# Altium footprint library TimeCard-NIC-V1.PcbLib: 104 footprints (part 6 of 7)
Each footprint in its own frame and in the unit in brackets; x right, y up, seen from the top. Pads: shape width x height; smd on the part's side, far side on the other; paste and mask are expansions set on the pad; w line width, h text height; cw(c..) or ccw(c..) is an arc to the next point about the centre after c.
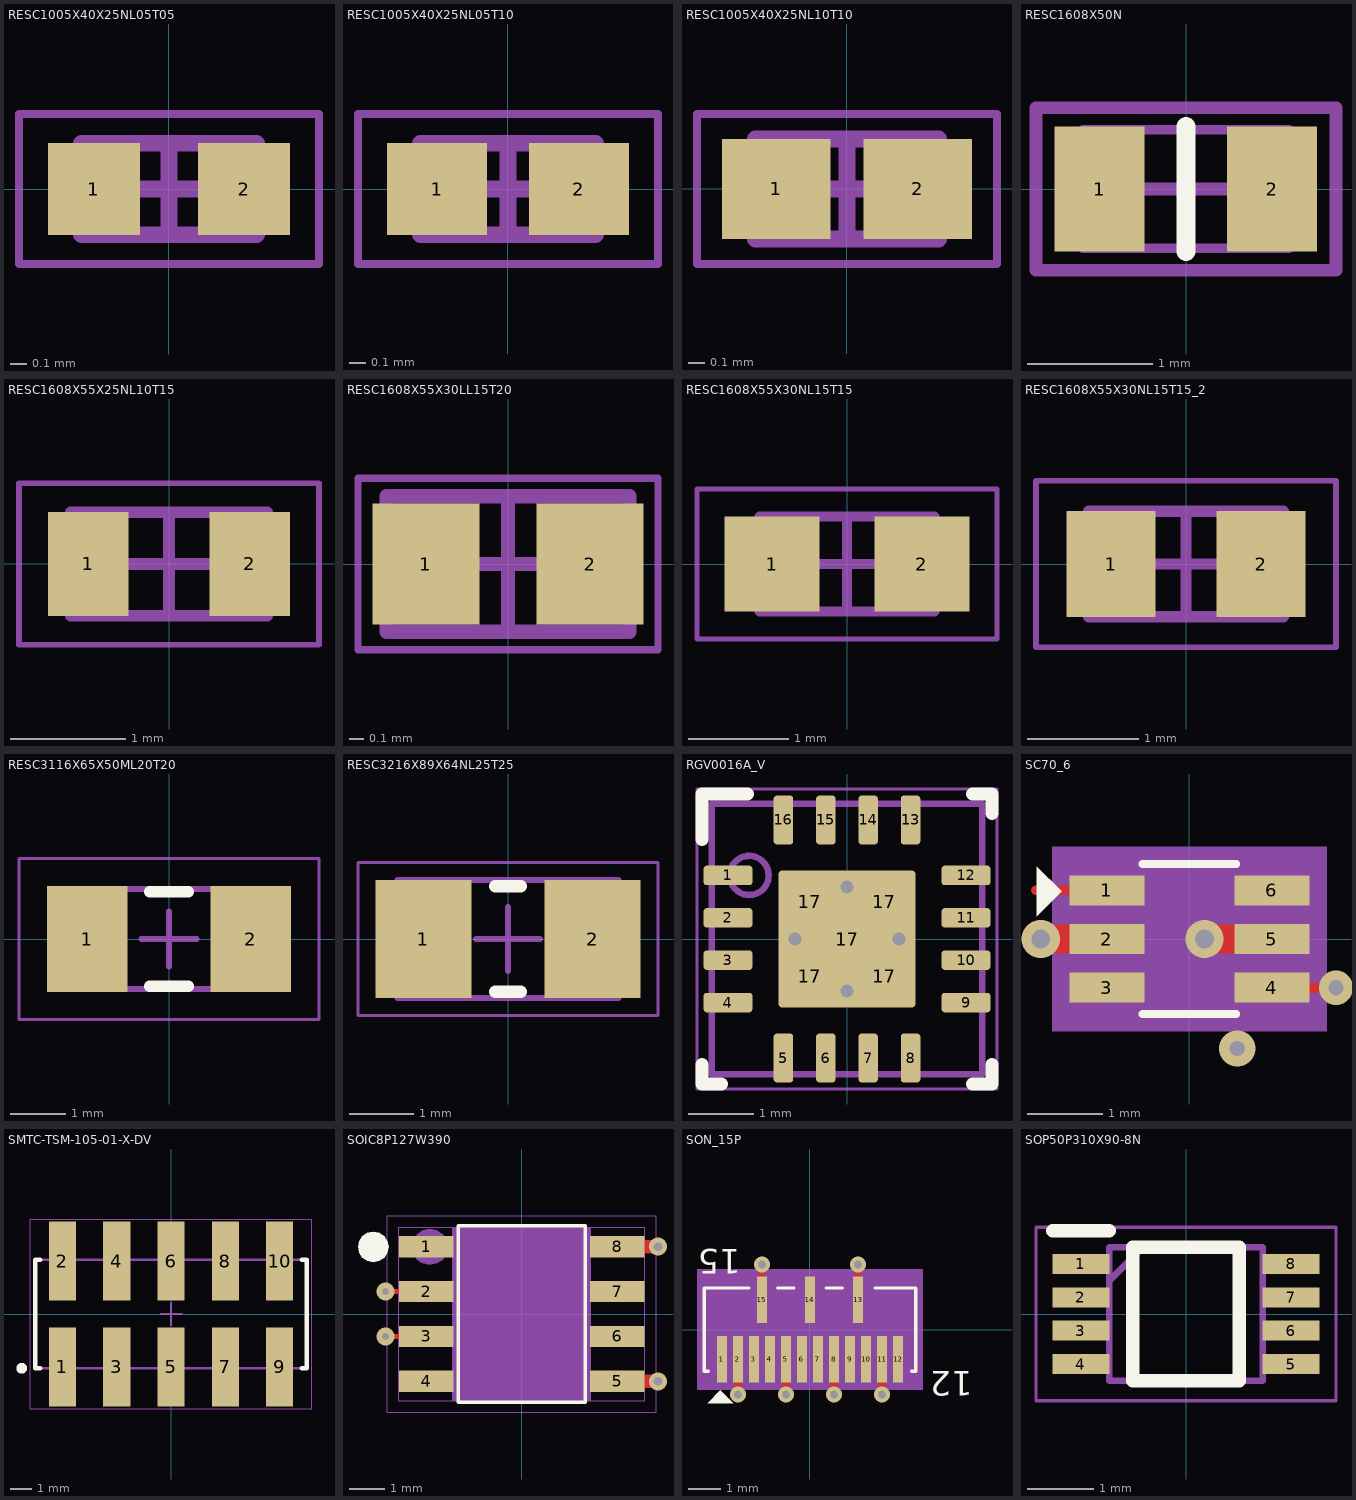
[diagram p5: the footprints below, top view; thin cyan lines are the x and y axes]

## RESC1005X40X25NL05T05 [mm] "Chip Resistor, 2-Leads, Body 1.00x0.50mm, IPC Medium Density"
height 0.4
pads (2):
  rect 0.55x0.55 smd: 1(-0.45,0) 2(0.45,0)
Mechanical 13:
  lines w0.1: -0.525,-0.275 0.525,-0.275 0.525,0.275 -0.525,0.275 -0.525,-0.275
Mechanical 15:
  lines w0.05: -0.9,-0.45 0.9,-0.45 0.9,0.45 -0.9,0.45 -0.9,-0.45
  lines w0.1: -0.275,0 0.275,0 ; 0,-0.275 0,0.275
3D body: height 0.4, standoff 0, extent 0.275,-0.275 0.525,0.275
3D body: height 0.4, standoff 0, extent -0.525,-0.275 -0.275,0.275
3D body: height 0.4, standoff 0, extent -0.275,-0.275 0.275,0.275

## RESC1005X40X25NL05T10 [mm] "Chip Resistor, 2-Leads, Body 1.00x0.50mm, IPC Medium Density"
height 0.4
pads (2):
  rect 0.6x0.55 smd: 1(-0.425,0) 2(0.425,0)
Mechanical 13:
  lines w0.1: -0.525,-0.275 0.525,-0.275 0.525,0.275 -0.525,0.275 -0.525,-0.275
Mechanical 15:
  lines w0.05: -0.9,-0.45 0.9,-0.45 0.9,0.45 -0.9,0.45 -0.9,-0.45
  lines w0.1: -0.275,0 0.275,0 ; 0,-0.275 0,0.275
3D body: height 0.4, standoff 0, extent 0.275,-0.275 0.525,0.275
3D body: height 0.4, standoff 0, extent -0.525,-0.275 -0.275,0.275
3D body: height 0.4, standoff 0, extent -0.275,-0.275 0.275,0.275

## RESC1005X40X25NL10T10 [mm] "Chip Resistor, 2-Leads, Body 1.00x0.50mm, IPC Medium Density"
height 0.4
pads (2):
  rect 0.65x0.6 smd: 1(-0.425,0) 2(0.425,0)
Mechanical 13:
  lines w0.1: -0.55,-0.3 0.55,-0.3 0.55,0.3 -0.55,0.3 -0.55,-0.3
Mechanical 15:
  lines w0.05: -0.9,-0.45 0.9,-0.45 0.9,0.45 -0.9,0.45 -0.9,-0.45
  lines w0.1: -0.3,0 0.3,0 ; 0,-0.3 0,0.3
3D body: height 0.4, standoff 0, extent 0.3,-0.3 0.55,0.3
3D body: height 0.4, standoff 0, extent -0.55,-0.3 -0.3,0.3
3D body: height 0.4, standoff 0, extent -0.3,-0.3 0.3,0.3

## RESC1608X50N [mm] "Chip Resistor, 0603, 2-Leads, Body 1.57x0.85mm, IPC Medium Density"
height 0.5
pads (2):
  rect 0.72x1 smd: 1(-0.69,0) 2(0.69,0)
Top Overlay:
  lines w0.152: 0,-0.5 0,0.5
Mechanical 13:
  lines w0.076: -0.825,-0.475 0.825,-0.475 0.825,0.475 -0.825,0.475 -0.825,-0.475
  text ".Designator" at -0.774,-0.327 h1.02
Mechanical 15:
  lines w0.102: -0.475,0 0.475,0 ; 0,-0.475 0,0.475 ; -1.2,-0.65 1.2,-0.65 1.2,0.65 -1.2,0.65 -1.2,-0.65
3D body: height 0.5, standoff 0, extent 0.525,-0.475 0.825,0.475
3D body: height 0.5, standoff 0, extent -0.825,-0.475 -0.525,0.475
3D body: height 0.5, standoff 0, extent -0.525,-0.475 0.525,0.475

## RESC1608X55X25NL10T15 [mm] "Chip Resistor, 2-Leads, Body 1.70x0.90mm, IPC Medium Density"
height 0.55
pads (2):
  rect 0.7x0.9 smd: 1(-0.7,0) 2(0.7,0)
Mechanical 13:
  lines w0.1: -0.85,-0.45 0.85,-0.45 0.85,0.45 -0.85,0.45 -0.85,-0.45
Mechanical 15:
  lines w0.05: -1.3,-0.7 1.3,-0.7 1.3,0.7 -1.3,0.7 -1.3,-0.7
  lines w0.1: -0.45,0 0.45,0 ; 0,-0.45 0,0.45
3D body: height 0.55, standoff 0, extent 0.6,-0.45 0.85,0.45
3D body: height 0.55, standoff 0, extent -0.85,-0.45 -0.6,0.45
3D body: height 0.55, standoff 0, extent -0.6,-0.45 0.6,0.45

## RESC1608X55X30LL15T20 [mm] "Chip Resistor, 2-Leads, Body 1.7x0.95mm, IPC High Density"
height 0.55
pads (2):
  rect 0.75x0.85 smd: 1(-0.575,0) 2(0.575,0)
Mechanical 13:
  lines w0.1: -0.85,-0.475 0.85,-0.475 0.85,0.475 -0.85,0.475 -0.85,-0.475
Mechanical 15:
  lines w0.05: -1.05,-0.6 1.05,-0.6 1.05,0.6 -1.05,0.6 -1.05,-0.6
  lines w0.1: -0.475,0 0.475,0 ; 0,-0.475 0,0.475
3D body "RESC1508X06L.step": height 0.55, standoff 0, extent -0.85,-0.475 0.85,0.475

## RESC1608X55X30NL15T15 [mm] "Chip Resistor, 2-Leads, Body 1.75x0.95mm, IPC Medium Density"
height 0.55
pads (2):
  rect 0.95x0.95 smd: 1(-0.75,0) 2(0.75,0)
Mechanical 13:
  lines w0.1: -0.875,-0.475 -0.875,0.475 0.875,0.475 0.875,-0.475 -0.875,-0.475
Mechanical 15:
  lines w0.05: -1.5,-0.75 -1.5,0.75 1.5,0.75 1.5,-0.75 -1.5,-0.75
  lines w0.1: -0.475,0 0.475,0 ; 0,-0.475 0,0.475
3D body "RESC1608X06N.step": height 0.55, standoff 0, extent -0.875,-0.475 0.875,0.475

## RESC1608X55X30NL15T15_2 [mm]
pads (2):
  rect 0.8x0.95 smd: 1(-0.675,0) 2(0.675,0)
Mechanical 13:
  lines w0.1: -0.875,-0.475 -0.875,0.475 0.875,0.475 0.875,-0.475 -0.875,-0.475
Mechanical 15:
  lines w0.05: -1.35,-0.75 -1.35,0.75 1.35,0.75 1.35,-0.75 -1.35,-0.75
  lines w0.1: -0.475,0 0.475,0 ; 0,-0.475 0,0.475
3D body: height 0.55, standoff 0, extent -0.575,-0.475 0.575,0.475
3D body: height 0.55, standoff 0, extent -0.875,-0.475 -0.575,0.475
3D body: height 0.55, standoff 0, extent 0.575,-0.475 0.875,0.475

## RESC3116X65X50ML20T20 [mm] "Chip Resistor, 2-Leads, Body 3.10x1.60mm, IPC Low Density"
height 0.65
pads (2):
  rect 1.45x1.9 smd: 1(-1.475,0) 2(1.475,0)
Top Overlay:
  lines w0.2: -0.35,-0.85 0.35,-0.85 ; -0.35,0.85 0.35,0.85
Mechanical 13:
  lines w0.1: -1.65,-0.9 1.65,-0.9 1.65,0.9 -1.65,0.9 -1.65,-0.9
Mechanical 15:
  lines w0.05: -2.7,-1.45 2.7,-1.45 2.7,1.45 -2.7,1.45 -2.7,-1.45
  lines w0.1: -0.5,0 0.5,0 ; 0,-0.5 0,0.5
3D body: height 0.65, standoff 0, extent 1.15,-0.9 1.65,0.9
3D body: height 0.65, standoff 0, extent -1.65,-0.9 -1.15,0.9
3D body: height 0.65, standoff 0, extent -1.15,-0.9 1.15,0.9

## RESC3216X89X64NL25T25 [mm] "Chip Resistor, 2-Leads, Body 3.20x1.60mm, IPC Medium Density"
height 0.89
pads (2):
  rect 1.5x1.85 smd: 1(-1.325,0) 2(1.325,0)
Top Overlay:
  lines w0.2: -0.2,-0.825 0.2,-0.825 ; -0.2,0.825 0.2,0.825
Mechanical 13:
  lines w0.1: -1.725,-0.925 1.725,-0.925 1.725,0.925 -1.725,0.925 -1.725,-0.925
Mechanical 15:
  lines w0.05: -2.35,-1.2 2.35,-1.2 2.35,1.2 -2.35,1.2 -2.35,-1.2
  lines w0.1: -0.5,0 0.5,0 ; 0,-0.5 0,0.5
3D body: height 0.89, standoff 0, extent 1.085,-0.925 1.725,0.925
3D body: height 0.89, standoff 0, extent -1.725,-0.925 -1.085,0.925
3D body: height 0.89, standoff 0, extent -1.085,-0.925 1.085,0.925

## RGV0016A_V [mm] "QFN, 16-Leads, Body 4x4mm, Pitch 0.65mm, Thermal Pad 2.16x2.16mm, TI Recommended"
height 1
pads (21):
  rrect33% 0.75x0.3 smd: 1(-1.825,0.975) 2(-1.825,0.325) 3(-1.825,-0.325) 4(-1.825,-0.975) 9(1.825,-0.975) 10(1.825,-0.325) 11(1.825,0.325) 12(1.825,0.975)
  rrect33% 0.3x0.75 smd: 5(-0.975,-1.825) 6(-0.325,-1.825) 7(0.325,-1.825) 8(0.975,-1.825) 13(0.975,1.825) 14(0.325,1.825) 15(-0.325,1.825) 16(-0.975,1.825)
  rrect50% 0.939x0.939 on Top Paste: 17(-0.57,-0.57) 17(-0.57,0.57) 17(0.57,-0.57) 17(0.57,0.57)
  rrect5% 2.1x2.1 smd paste-1.08: 17(0,0)
via 0,0.8 diameter 0.5 hole 0.2
via 0,-0.8 diameter 0.5 hole 0.2
via -0.8,0 diameter 0.5 hole 0.2
via 0.8,0 diameter 0.5 hole 0.2
Top Overlay:
  lines w0.2: -2.225,-1.925 -2.225,-2.225 -1.925,-2.225 ; -2.225,1.525 -2.225,2.225 -1.525,2.225 ; 1.925,-2.225 2.225,-2.225 2.225,-1.925 ; 1.925,2.225 2.225,2.225 2.225,1.925
Mechanical 1:
  text ".Designator" at -1.854,-0.508 h1.02
Mechanical 13:
  circle w0.1: c-1.5,0.975 r0.3
  lines w0.1: -2.075,-2.075 -2.075,2.075 2.075,2.075 2.075,-2.075 -2.075,-2.075
Mechanical 15:
  lines w0.05: -2.3,-2.3 2.3,-2.3 2.3,2.3 -2.3,2.3 -2.3,-2.3
  lines w0.1: -0.5,0 0.5,0 ; 0,-0.5 0,0.5
3D body: height 1, standoff 0, extent -2.075,-2.075 2.075,2.075
3D body: height 1.01, standoff 0.5, extent -1.799,0.676 -1.201,1.274

## SC70_6 [mm] "SC70_6"
height 10.85
pads (6):
  rect 1x0.4 smd: 1(-1.1,0.65) 2(-1.1,0) 3(-1.1,-0.65) 4(1.1,-0.65) 5(1.1,0) 6(1.1,0.65)
via 0.203,0 diameter 0.508 hole 0.249
via -1.981,0 diameter 0.508 hole 0.249
via 1.956,-0.65 diameter 0.457 hole 0.203
via 0.64,-1.46 diameter 0.483 hole 0.203
Top Layer:
  lines w0.132: -2.044,0.65 -1.1,0.65 ; 1.1,-0.65 1.956,-0.65
  lines w0.381: -1.981,0 -1.1,0 ; 0.203,0 1.1,0
Top Overlay:
  dashed: -1.704,0.635 -2.032,0.307 -2.032,0.963
  lines w0.102: -0.625,-1 0.625,-1 ; -0.625,1 0.625,1
  text ".Designator" at -2.54,1.033 h0.76
Top 3D Body:
  region: -0.68,1.1 -0.68,-1.1 0.68,-1.1 0.68,1.1
Top Courtyard:
  dashed: -1.6,-1.1 -1.6,1.1 1.6,1.1 1.6,-1.1
Top Assembly:
  lines w0.025: -0.675,-1.1 0.675,-1.1 0.675,1.1 -0.675,1.1 -0.675,-1.1
Bottom Component Center:
  text "3" at -1.293,-0.635 h0.64
  text "1" at -1.293,0.762 h0.64
  text "5" at 1.039,0 h0.64
  text "4" at 1.039,-0.635 h0.64
  text "2" at -1.293,0 h0.64
  text "6" at 1.039,0.762 h0.64
Top Component Outline:
  text "ALSO COVERS TI SC_70 PARTS" at -7.747,23.622 h0.64
  text "SYMB NAME: SC70_6" at -8.128,21.082 h0.64
  text "COMP. HT:40 MIL" at -8.128,18.542 h0.64
  text "DIM IN INCH" at -8.001,13.208 h0.64
  text "PADSTACKS: R16_40" at -8.001,16.002 h0.64
  text "REVISED 11-9-10 C.HENLEY" at -7.747,10.541 h0.64
  text "MAN: NC7SB3157P6X" at -7.874,26.035 h0.64
  text "CONVERTED TO METRIC AND UPDATES FOR 2018 LIBRARY" at -4.445,7.62 h0.64
Mechanical 30:
  dashed: -1.83,-1.23 -1.83,1.23 1.83,1.23 1.83,-1.23
3D body: height 3.81, standoff 0, extent -0.68,-1.1 0.68,1.1

## SMTC-TSM-105-01-X-DV [mm] "Double Row Gullwing ASM, 2x5 Pins, Vertical, 2.54mm Pitch, Male"
height 9.9
pads (10):
  rect 1.27x3.68 smd: 1(-5.08,-2.475) 2(-5.08,2.475) 3(-2.54,-2.475) 4(-2.54,2.475) 5(0,-2.475) 6(0,2.475) 7(2.54,-2.475) 8(2.54,2.475) 9(5.08,-2.475) 10(5.08,2.475)
Top Overlay:
  circle w0.25: c-6.985,-2.54 r0.125
  lines w0.2: -6.115,-2.54 -6.35,-2.54 -6.35,2.54 -6.115,2.54 ; 6.115,-2.54 6.35,-2.54 6.35,2.54 6.115,2.54
Mechanical 13:
  lines w0.1: -6.35,-2.54 -6.35,2.54 6.35,2.54 6.35,-2.54 -6.35,-2.54
Mechanical 15:
  lines w0.05: -6.575,-4.44 6.575,-4.44 6.575,4.44 -6.575,4.44 -6.575,-4.44
  lines w0.1: -0.5,0 0.5,0 ; 0,-0.5 0,0.5
3D body "TSM-105-01-X-DV.step": height 9.65, standoff 0, extent -6.35,-3.683 6.35,3.683

## SOIC8P127W390 [mm] "SOIC8P127W390"
height 10.85
pads (8):
  rect 1.55x0.6 smd: 1(-2.7,1.905) 2(-2.7,0.635) 3(-2.7,-0.635) 4(-2.7,-1.905) 5(2.7,-1.905) 6(2.7,-0.635) 7(2.7,0.635) 8(2.7,1.905)
via -3.852,0.635 diameter 0.5 hole 0.203
via -3.852,-0.635 diameter 0.5 hole 0.203
via 3.856,1.905 diameter 0.508 hole 0.249
via 3.856,-1.905 diameter 0.508 hole 0.249
Top Layer:
  lines w0.132: -3.852,-0.635 -2.7,-0.635 ; -3.852,0.635 -2.7,0.635
  lines w0.381: 2.7,-1.905 3.856,-1.905 ; 2.7,1.905 3.856,1.905
Top Overlay:
  dashed: -3.768,1.9 -3.801,2.065 -3.894,2.206 -4.035,2.299 -4.2,2.332 -4.365,2.299 -4.412,2.268 -4.506,2.206 -4.599,2.065 -4.632,1.9 -4.599,1.735 -4.506,1.594 -4.412,1.532 -4.365,1.501 -4.2,1.468 -4.035,1.501 -3.894,1.594 -3.801,1.735
  lines w0.102: -1.8,-2.5 -1.8,2.5 1.8,2.5 1.8,-2.5 -1.8,-2.5
  text ".Designator" at -4.309,-0.825 h0.76
Top 3D Body:
  region: -1.95,-2.45 1.95,-2.45 1.95,2.45 -1.95,2.45
Top Courtyard:
  lines w0.025: -3.475,-2.45 3.475,-2.45 3.475,2.45 -3.475,2.45 -3.475,-2.45
Top Assembly:
  dashed: -2.09,1.9 -2.129,2.095 -2.24,2.26 -2.405,2.371 -2.6,2.41 -2.795,2.371 -2.851,2.334 -2.96,2.26 -3.071,2.095 -3.11,1.9 -3.071,1.705 -2.96,1.54 -2.851,1.466 -2.795,1.429 -2.6,1.39 -2.405,1.429 -2.24,1.54 -2.129,1.705
  lines w0.025: -1.95,-2.45 1.95,-2.45 1.95,2.45 -1.95,2.45 -1.95,-2.45
Bottom Component Center:
  text "8" at 2.09,1.905 h1.52
  text "3" at -3.31,-0.635 h1.52
  text "2" at -3.31,0.635 h1.52
  text "5" at 2.09,-1.905 h1.52
  text "4" at -3.31,-1.905 h1.52
  text "1" at -3.31,1.905 h1.52
  text "6" at 2.09,-0.635 h1.52
  text "7" at 2.09,0.635 h1.52
Mechanical 26:
  lines w0.025: -3.805,-2.78 3.805,-2.78 3.805,2.78 -3.805,2.78 -3.805,-2.78
Top Component Outline:
  text "PKG_TYPE: SOIC8P128W390" at -3.5,13 h0.64
  text "BUILT FOR MICROCHIP94LC56B I/SN" at -3.4,11.2 h0.64
  text "CAROL H. 11-30-18" at -3.4,9.4 h0.64
3D body: height 3.81, standoff 0, extent -1.95,-2.45 1.95,2.45

## SON_15P [mm] "SON_15P"
height 10.85
pads (15):
  rect 0.3x1.45 smd: 1(-2.75,-0.925) 2(-2.25,-0.925) 3(-1.75,-0.925) 4(-1.25,-0.925) 5(-0.75,-0.925) 6(-0.25,-0.925) 7(0.25,-0.925) 8(0.75,-0.925) 9(1.25,-0.925) 10(1.75,-0.925) 11(2.25,-0.925) 12(2.75,-0.925) 13(1.5,0.925) 14(0,0.925) 15(-1.5,0.925)
via 0.75,-2.031 diameter 0.508 hole 0.249
via -0.75,-2.031 diameter 0.508 hole 0.249
via -1.5,2.031 diameter 0.508 hole 0.249
via -2.25,-2.031 diameter 0.508 hole 0.249
via 2.25,-2.031 diameter 0.508 hole 0.249
via 1.5,2.031 diameter 0.508 hole 0.249
Top Layer:
  lines w0.203: -1.5,0.925 -1.5,2.031 ; 1.5,0.925 1.5,2.031
  lines w0.254: -2.25,-2.031 -2.25,-0.925 ; -0.75,-2.031 -0.75,-0.925 ; 0.75,-2.031 0.75,-0.925 ; 2.25,-2.031 2.25,-0.925
Top Overlay:
  dashed: -2.8,-1.9 -3.2,-2.3 -2.4,-2.3
  lines w0.102: -3.175,-1.3 -3.3,-1.3 -3.3,1.3 -1.905,1.3 ; -1.016,1.3 -0.508,1.3 ; 0.508,1.3 1.016,1.3 ; 2.032,1.3 3.3,1.3 3.3,-1.3 3.175,-1.3
  text "15" at -2.159,2.508 h0.76
  text "12" at 5.08,-1.302 h0.76
Top 3D Body:
  region: -3.3,1.3 3.3,1.3 3.3,-1.3 -3.3,-1.3
Top Courtyard:
  dashed: -3.3,-1.65 3.3,-1.65 3.3,1.65 -3.3,1.65
Top Assembly:
  dashed: -2.8,-0.1 -2.4,0.3 -3.2,0.3
  lines w0.025: -3.3,-1.3 3.3,-1.3 3.3,1.3 -3.3,1.3 -3.3,-1.3
  text ".Designator" at -3.861,-0.423 h1.02
Top Component Center:
  circle w0.025: c0,0 r0.254
  lines w0.025: -0.254,0 0.254,0 ; 0,-0.254 0,0.254
Bottom Component Center:
  text "12" at 3.258,-0.925 h0.64
  text "6" at 0.004,-0.925 h0.64
  text "1" at -2.496,-0.925 h0.64
  text "4" at -0.996,-0.925 h0.64
  text "7" at 0.504,-0.925 h0.64
  text "9" at 1.504,-0.925 h0.64
  text "3" at -1.496,-0.925 h0.64
  text "10" at 2.258,-0.925 h0.64
  text "11" at 2.758,-1.2 h0.64
  text "8" at 1.004,-0.925 h0.64
  text "5" at -0.496,-0.925 h0.64
  text "2" at -1.996,-0.925 h0.64
  text "15" at -0.992,0.925 h0.64
  text "13" at 2.008,0.925 h0.64
  text "14" at 0.508,0.925 h0.64
Mechanical 26:
  dashed: -3.53,-1.88 3.53,-1.88 3.53,1.88 -3.53,1.88
Top Component Outline:
  text "Checked by: C. HENLEY 8/24/10" at -12.126,13.99 h1.02
  text "Created by: MN 8/20/10" at -12.163,16.53 h1.02
  text "DIM IN MM" at -12.301,19.105 h1.02
  text "COMP HT:.8MM" at -12.471,21.685 h1.02
  text "SYM NAME:SON_15P" at -12.605,24.225 h1.02
  text "MFR:TI TPD8S009DSMR" at -12.486,26.765 h1.02
  text "CONVERTED BY: GI 07-06-20" at -12.062,11.504 h1.02
  text "RECHECK: CH 7-7-20" at -12.362,8.904 h1.02
3D body: height 3.81, standoff 0, extent -3.3,-1.3 3.3,1.3

## SOP50P310X90-8N [mm]
height 1.7
pads (8):
  rect 0.85x0.3 smd: 1(-1.575,0.75) 2(-1.575,0.25) 3(-1.575,-0.25) 4(-1.575,-0.75) 5(1.575,-0.75) 6(1.575,-0.25) 7(1.575,0.25) 8(1.575,0.75)
Top Overlay:
  lines w0.2: -2,1.25 -1.15,1.25 ; -0.8,-1 0.8,-1 0.8,1 -0.8,1 -0.8,-1
Mechanical 13:
  lines w0.1: -1.15,0.5 -0.65,1 ; -1.15,-1 1.15,-1 1.15,1 -1.15,1 -1.15,-1
Mechanical 15:
  lines w0.05: -2.25,-1.3 2.25,-1.3 2.25,1.3 -2.25,1.3 -2.25,-1.3
3D body "NC7WV125K8X.stp": height 0.9, standoff 0, extent -1.55,-1 1.55,1